# Altium footprint library TarabusLib_KAP.PcbLib: 504 footprints (part 32 of 32)
Each footprint in its own frame and in the unit in brackets; x right, y up, seen from the top. Pads: shape width x height; smd on the part's side, far side on the other; paste and mask are expansions set on the pad; w line width, h text height; cw(c..) or ccw(c..) is an arc to the next point about the centre after c.
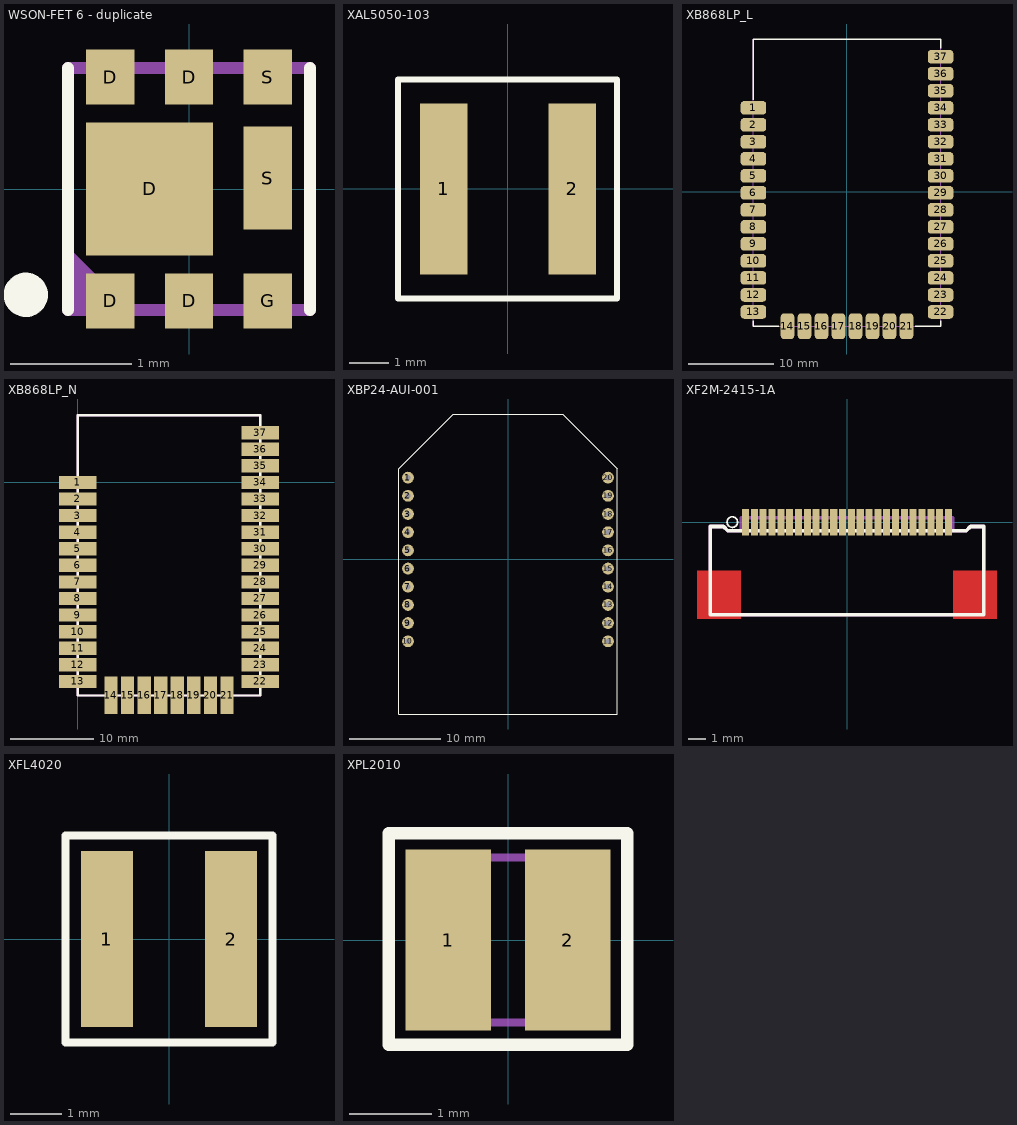
[diagram p31: the footprints below, top view; thin cyan lines are the x and y axes]

## WSON-FET 6 - duplicate [mm]
height 0.8
pads (8):
  rect 0.4x0.455 smd mask+0.05: D(-0.65,-0.925) D(-0.65,0.925) D(0,-0.925) D(0,0.925) G(0.65,-0.925) S(0.65,0.925)
  rect 1.05x1.1 smd mask+0.05: D(-0.325,0)
  rect 0.4x0.85 smd mask+0.05: S(0.65,0.09)
Top Overlay:
  circle w0.254: c-1.35,-0.875 r0.056
  lines w0.1: -1,-1 -1,1 ; 1,-1 1,1
Mechanical 7:
  lines w0.1: -1,-0.875 -0.888,-0.988 ; -1,-0.675 -0.7,-0.975 -0.8,-0.975 -0.986,-0.789 ; -0.993,-0.557 -0.55,-1 ; -1,-1 1,-1 1,1 -1,1 -1,-1
Mechanical 9:
  lines w0.1: -1,-1 -1,1 1,1 1,-1 -1,-1
Mechanical 10:
  text ".Designator" at -1.225,1.475 h0.8
  text ".Comment" at -1.125,-1.8 h0.8
3D body: height 0.8, standoff 0.05, extent -1,-1 1,1

## XAL5050-103 [mm]
height 2.1
pads (2):
  rect 1.2x4.3 smd: 1(-1.6,0) 2(1.625,0)
Top Overlay:
  lines w0.15: -2.75,-2.75 -2.75,2.75 2.75,2.75 2.75,-2.75 -2.75,-2.75
Mechanical 7:
  lines w0.1: -2.75,-2.75 2.75,-2.75 2.75,2.75 -2.75,2.75 -2.75,-2.75
Mechanical 10:
  text ".Comment" at -1,-3 h0.6
  text ".Designator" at -1.5,2.5 h0.8
3D body "Coilcraft-XAL5050-103.step": height 5.1, standoff 0, extent -2.74,-2.84 2.74,2.84

## XB868LP_L [mm]
height 3.1
pads (37):
  rrect50% 3x1.6 smd mask+0: 1(-11,9.84) 2(-11,7.84) 3(-11,5.84) 4(-11,3.84) 5(-11,1.84) 6(-11,-0.16) 7(-11,-2.16) 8(-11,-4.16) 9(-11,-6.16) 10(-11,-8.16) 11(-11,-10.16) 12(-11,-12.16) 13(-11,-14.16) 22(11,-14.16) 23(11,-12.16) 24(11,-10.16) 25(11,-8.16) 26(11,-6.16) 27(11,-4.16) 28(11,-2.16) 29(11,-0.16) 30(11,1.84) 31(11,3.84) 32(11,5.84) 33(11,7.84) 34(11,9.84) 35(11,11.84) 36(11,13.84) 37(11,15.84)
  rrect50% 1.6x3 smd mask+0: 14(-7,-15.84) 15(-5,-15.84) 16(-3,-15.84) 17(-1,-15.84) 18(1,-15.84) 19(3,-15.84) 20(5,-15.84) 21(7,-15.84)
Top Overlay:
  lines w0.15: -11,-15.2 -11,-15.84 -8.05,-15.84 ; -11,10.825 -11,17.94 11,17.94 11,16.825 ; 8.05,-15.84 11,-15.84 11,-15.2
Mechanical 7:
  lines w0.1: -11,-15.84 11,-15.84 11,17.94 -11,17.94 -11,-15.84
Mechanical 10:
  text ".Comment" at -0.7,-0.75 h0.6
  text ".Designator" at -1.275,1.15 h0.8
3D body: height 3.1, standoff 0, extent -11,-15.84 11,9.84
3D body: height 1, standoff 0, extent -11,9.84 11,17.94

## XB868LP_N [mm]
pads (37):
  rect 4.5x1.6 smd mask+0: 1(0,0) 2(0,-2) 3(0,-4) 4(0,-6) 5(0,-8) 6(0,-10) 7(0,-12) 8(0,-14) 9(0,-16) 10(0,-18) 11(0,-20) 12(0,-22) 13(0,-24) 22(22,-24) 23(22,-22) 24(22,-20) 25(22,-18) 26(22,-16) 27(22,-14) 28(22,-12) 29(22,-10) 30(22,-8) 31(22,-6) 32(22,-4) 33(22,-2) 34(22,0) 35(22,2) 36(22,4) 37(22,6)
  rect 1.6x4.5 smd mask+0: 14(4,-25.68) 15(6,-25.68) 16(8,-25.68) 17(10,-25.68) 18(12,-25.68) 19(14,-25.68) 20(16,-25.68) 21(18,-25.68)
Top Overlay:
  lines w0.254: 0,-25.68 22,-25.68 22,8.1 0,8.1 0,-25.68
Mechanical 1:
  lines w0.254: 0,-25.68 0,8.1 22,8.1 22,-25.68 0,-25.68
3D body: height 5, standoff 0, extent -0.127,-25.807 22.127,8.227

## XBP24-AUI-001 [mm]
pads (20):
  round 1.3 hole 0.6: 1(-11,9) 2(-11,7) 3(-11,5) 4(-11,3) 5(-11,1) 6(-11,-1) 7(-11,-3) 8(-11,-5) 9(-11,-7) 10(-11,-9) 11(11,-9) 12(11,-7) 13(11,-5) 14(11,-3) 15(11,-1) 16(11,1) 17(11,3) 18(11,5) 19(11,7) 20(11,9)
Top Overlay:
  lines w0.1: -12,10 -12,10 ; -12,10 -6,16 6,16 12,10 12,-17 -12,-17 -12,10
3D body "SW3dPS-XBEE Pro.STEP": height 13.2, standoff -0.39, extent -12.1,-16.37 12.28,16.57

## XF2M-2415-1A [mm] "Rotary backlock connector (0.5 mm)"
height 3.4
pads (24):
  rect 0.4x1.5 smd mask+0.02: 1(-5.75,0) 2(-5.25,0) 3(-4.75,0) 4(-4.25,0) 5(-3.75,0) 6(-3.25,0) 7(-2.75,0) 8(-2.25,0) 9(-1.75,0) 10(-1.25,0) 11(-0.75,0) 12(-0.25,0) 13(0.25,0) 14(0.75,0) 15(1.25,0) 16(1.75,0) 17(2.25,0) 18(2.75,0) 19(3.25,0) 20(3.75,0) 21(4.25,0) 22(4.75,0) 23(5.25,0) 24(5.75,0)
Top Layer:
  rectangle: 6,-5.5 8.5,-2.75
  rectangle: -8.5,-5.5 -6,-2.75
Top Overlay:
  circle w0.1: c-6.5,0 r0.301
  lines w0.2: -7.75,-5.25 7.75,-5.25 7.75,-0.25 7,-0.25 6.75,-0.5 -6.75,-0.5 -7,-0.25 -7.75,-0.25 -7.75,-5.25
Top Solder:
  rectangle: 6,-5.5 8.5,-2.75
  rectangle: -8.5,-5.5 -6,-2.75
Mechanical 7:
  lines w0.2: -6,-0.5 -6,0.25 6,0.25 6,-0.5 ; -7.75,-5.25 -7.75,-0.25 -7,-0.25 -6.75,-0.5 6.75,-0.5 7,-0.25 7.75,-0.25 7.75,-5.25 -7.75,-5.25
Mechanical 10:
  text ".Designator" at -8.025,1.125 h0.8
  text ".Comment" at -5.75,-5.75 h0.6
3D body: height 0.3, standoff 0, extent -5.9,-0.6 -5.6,0.35
3D body: height 0.3, standoff 0, extent -5.4,-0.6 -5.1,0.35
3D body: height 0.3, standoff 0, extent -4.4,-0.6 -4.1,0.35
3D body: height 0.3, standoff 0, extent -4.9,-0.6 -4.6,0.35
3D body: height 0.3, standoff 0, extent -2.9,-0.6 -2.6,0.35
3D body: height 0.3, standoff 0, extent -2.4,-0.6 -2.1,0.35
3D body: height 0.3, standoff 0, extent -3.4,-0.6 -3.1,0.35
3D body: height 0.3, standoff 0, extent -3.9,-0.6 -3.6,0.35
3D body: height 0.3, standoff 0, extent 0.1,-0.6 0.4,0.35
3D body: height 0.3, standoff 0, extent 0.6,-0.6 0.9,0.35
3D body: height 0.3, standoff 0, extent 1.6,-0.6 1.9,0.35
3D body: height 0.3, standoff 0, extent 1.1,-0.6 1.4,0.35
3D body: height 0.3, standoff 0, extent -0.9,-0.6 -0.6,0.35
3D body: height 0.3, standoff 0, extent -0.4,-0.6 -0.1,0.35
3D body: height 0.3, standoff 0, extent -1.4,-0.6 -1.1,0.35
3D body: height 0.3, standoff 0, extent -1.9,-0.6 -1.6,0.35
3D body: height 0.3, standoff 0, extent 4.1,-0.6 4.4,0.35
3D body: height 0.3, standoff 0, extent 4.6,-0.6 4.9,0.35
3D body: height 0.3, standoff 0, extent 5.6,-0.6 5.9,0.35
3D body: height 0.3, standoff 0, extent 5.1,-0.6 5.4,0.35
3D body: height 0.3, standoff 0, extent 3.1,-0.6 3.4,0.35
3D body: height 0.3, standoff 0, extent 3.6,-0.6 3.9,0.35
3D body: height 0.3, standoff 0, extent 2.6,-0.6 2.9,0.35
3D body: height 0.3, standoff 0, extent 2.1,-0.6 2.4,0.35
3D body: height 3.1, standoff 0, extent -7.65,-5.15 7.65,-0.575
3D body: height 0.2, standoff 0, extent -7.95,-4.85 -7.65,-3.35
3D body: height 0.2, standoff 0, extent 7.625,-4.85 7.925,-3.35

## XFL4020 [mm]
height 2.1
pads (2):
  rect 1x3.4 smd: 1(-1.2,0) 2(1.2,0)
Top Overlay:
  lines w0.15: -2,-2 2,-2 2,2 -2,2 -2,-2
Mechanical 7:
  lines w0.1: -2,-2 -2,2 2,2 2,-2 -2,-2
Mechanical 10:
  text ".Designator" at -1.5,2.5 h0.8
  text ".Comment" at -1,-3 h0.6
3D body: height 2, standoff 0, extent -2,-2 2,2

## XPL2010 [mm]
height 1
pads (2):
  rect 1.04x2.2 smd: 1(-0.725,0) 2(0.725,0)
Top Overlay:
  lines w0.15: -1.45,-1.275 1.45,-1.275 1.45,1.3 -1.45,1.3 -1.45,-1.275
Mechanical 7:
  lines w0.1: -0.95,1 -0.95,-1.005 0.95,-1.005 0.95,1.005 -0.95,1.005
Mechanical 10:
  text ".Comment" at -1.425,-1.875 h0.6
  text ".Designator" at -1.425,1.55 h0.8
3D body: height 1, standoff 0, extent -0.95,-1.005 0.95,1.005